# Altium footprint library Connectors.PcbLib: 268 footprints (part 4 of 21)
Each footprint in its own frame and in the unit in brackets; x right, y up, seen from the top. Pads: shape width x height; smd on the part's side, far side on the other; paste and mask are expansions set on the pad; w line width, h text height; cw(c..) or ccw(c..) is an arc to the next point about the centre after c.
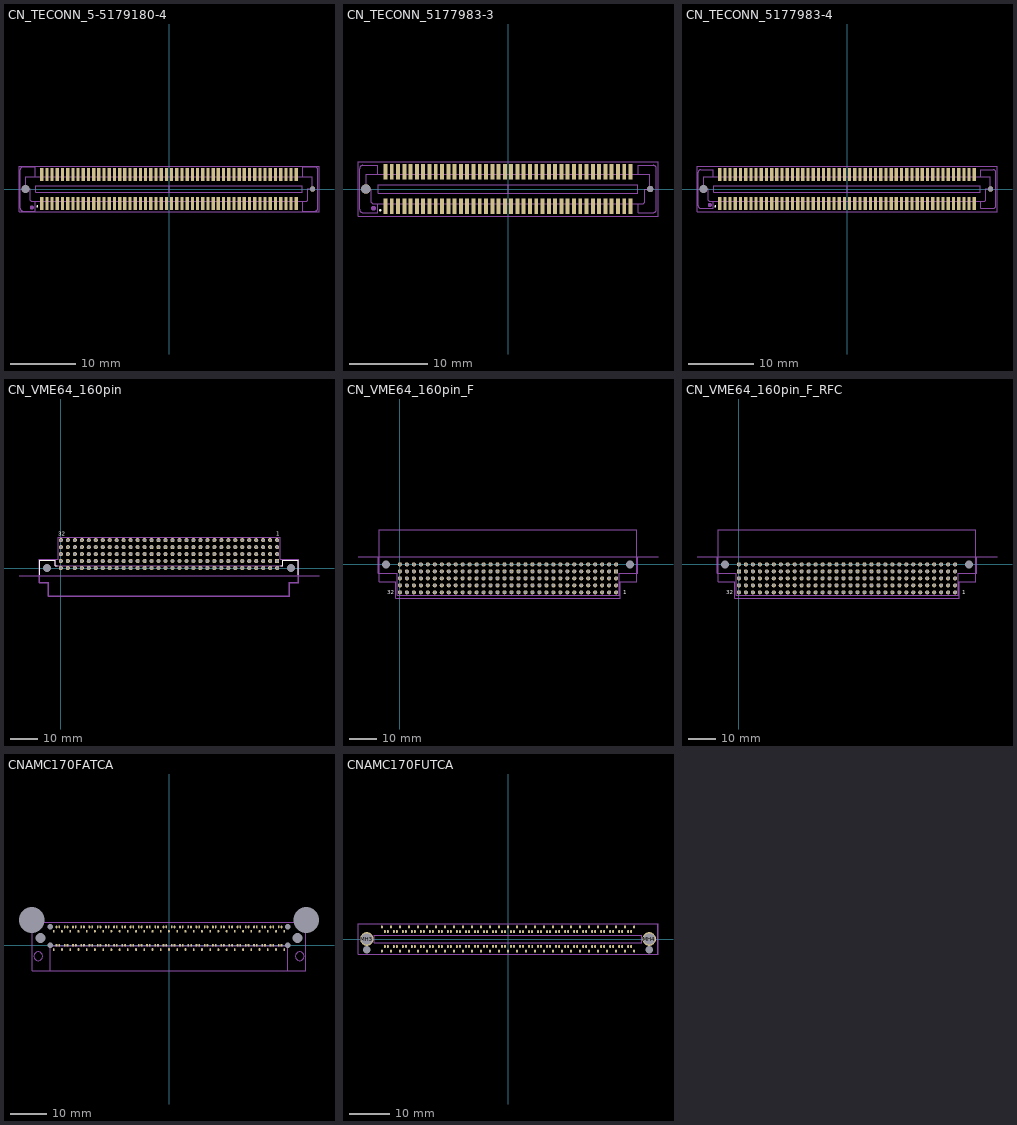
[diagram p3: the footprints below, top view; thin cyan lines are the x and y axes]

## CN_TECONN_5-5179180-4 [mm] "100pin 0.8mm Pitch Stacking Height 6mm Header-Stacking Connector female"
height 6
pads (102):
  rect 0.5x2 smd: 1(-19.6,-2.2) 2(-19.6,2.2) 3(-18.8,-2.2) 4(-18.8,2.2) 5(-18,-2.2) 6(-18,2.2) 7(-17.2,-2.2) 8(-17.2,2.2) 9(-16.4,-2.2) 10(-16.4,2.2) 11(-15.6,-2.2) 12(-15.6,2.2) 13(-14.8,-2.2) 14(-14.8,2.2) 15(-14,-2.2) 16(-14,2.2) 17(-13.2,-2.2) 18(-13.2,2.2) 19(-12.4,-2.2) 20(-12.4,2.2) 21(-11.6,-2.2) 22(-11.6,2.2) 23(-10.8,-2.2) 24(-10.8,2.2) 25(-10,-2.2) 26(-10,2.2) 27(-9.2,-2.2) 28(-9.2,2.2) 29(-8.4,-2.2) 30(-8.4,2.2) 31(-7.6,-2.2) 32(-7.6,2.2) 33(-6.8,-2.2) 34(-6.8,2.2) 35(-6,-2.2) 36(-6,2.2) 37(-5.2,-2.2) 38(-5.2,2.2) 39(-4.4,-2.2) 40(-4.4,2.2) 41(-3.6,-2.2) 42(-3.6,2.2) 43(-2.8,-2.2) 44(-2.8,2.2) 45(-2,-2.2) 46(-2,2.2) 47(-1.2,-2.2) 48(-1.2,2.2) 49(-0.4,-2.2) 50(-0.4,2.2) 51(0.4,-2.2) 52(0.4,2.2) 53(1.2,-2.2) 54(1.2,2.2) 55(2,-2.2) 56(2,2.2) 57(2.8,-2.2) 58(2.8,2.2) 59(3.6,-2.2) 60(3.6,2.2) 61(4.4,-2.2) 62(4.4,2.2) 63(5.2,-2.2) 64(5.2,2.2) 65(6,-2.2) 66(6,2.2) 67(6.8,-2.2) 68(6.8,2.2) 69(7.6,-2.2) 70(7.6,2.2) 71(8.4,-2.2) 72(8.4,2.2) 73(9.2,-2.2) 74(9.2,2.2) 75(10,-2.2) 76(10,2.2) 77(10.8,-2.2) 78(10.8,2.2) 79(11.6,-2.2) 80(11.6,2.2) 81(12.4,-2.2) 82(12.4,2.2) 83(13.2,-2.2) 84(13.2,2.2) 85(14,-2.2) 86(14,2.2) 87(14.8,-2.2) 88(14.8,2.2) 89(15.6,-2.2) 90(15.6,2.2) 91(16.4,-2.2) 92(16.4,2.2) 93(17.2,-2.2) 94(17.2,2.2) 95(18,-2.2) 96(18,2.2) 97(18.8,-2.2) 98(18.8,2.2) 99(19.6,-2.2) 100(19.6,2.2)
  round 0.79 hole 0.8 unplated: MH1(22.1,0)
  round 1.19 hole 1.2 unplated: MH2(-22.1,0)
Top Overlay:
  circle w0.178: c-20.274,-2.675 r0.074
Mechanical 13:
  circle w0.381: c-21.125,-2.85 r0.125
  lines w0.1: -22.9,-3 -22.9,3 ; -22.9,-3 ccw(c-22.5,-3) -22.5,-3.4 -20.6,-3.4 -20.6,-1.9 20.6,-1.9 20.6,-3.4 22.5,-3.4 ccw(c22.5,-3) 22.9,-3 22.9,3 ccw(c22.5,3) 22.5,3.4 20.6,3.4 20.6,1.9 -20.6,1.9 -20.6,3.4 -22.5,3.4 ccw(c-22.5,3) -22.9,3 ; -20.525,-0.525 -20.525,0.525 20.525,0.525 20.525,-0.525 -20.525,-0.525
  lines w0.102: -20.6,-1.9 -21.2,-1.9 -21.4,-1.7 -21.4,0 -22.075,0 -22.075,1.9 -20.6,1.9 ; 20.6,-1.9 21.199,-1.9 21.4,-1.7 21.4,0 22.075,0 22.075,1.9 20.6,1.9
Mechanical 15:
  lines w0.102: 0,-0.5 0,0.5 ; -23.1,-3.5 23.1,-3.5 23.1,3.5 -23.1,3.5 -23.1,-3.5
3D body "c-5-5179180-4-a-3d.stp": height 7.77, standoff -0.48, extent -22.9,-3.4 22.9,3.4

## CN_TECONN_5177983-3 [mm] "0.8mm Pitch Stacking Height 6mm Header-Stacking Connector female"
height 6
pads (82):
  rect 0.5x2 smd: 1(-15.6,-2.2) 2(-15.6,2.2) 3(-14.8,-2.2) 4(-14.8,2.2) 5(-14,-2.2) 6(-14,2.2) 7(-13.2,-2.2) 8(-13.2,2.2) 9(-12.4,-2.2) 10(-12.4,2.2) 11(-11.6,-2.2) 12(-11.6,2.2) 13(-10.8,-2.2) 14(-10.8,2.2) 15(-10,-2.2) 16(-10,2.2) 17(-9.2,-2.2) 18(-9.2,2.2) 19(-8.4,-2.2) 20(-8.4,2.2) 21(-7.6,-2.2) 22(-7.6,2.2) 23(-6.8,-2.2) 24(-6.8,2.2) 25(-6,-2.2) 26(-6,2.2) 27(-5.2,-2.2) 28(-5.2,2.2) 29(-4.4,-2.2) 30(-4.4,2.2) 31(-3.6,-2.2) 32(-3.6,2.2) 33(-2.8,-2.2) 34(-2.8,2.2) 35(-2,-2.2) 36(-2,2.2) 37(-1.2,-2.2) 38(-1.2,2.2) 39(-0.4,-2.2) 40(-0.4,2.2) 41(0.4,-2.2) 42(0.4,2.2) 43(1.2,-2.2) 44(1.2,2.2) 45(2,-2.2) 46(2,2.2) 47(2.8,-2.2) 48(2.8,2.2) 49(3.6,-2.2) 50(3.6,2.2) 51(4.4,-2.2) 52(4.4,2.2) 53(5.2,-2.2) 54(5.2,2.2) 55(6,-2.2) 56(6,2.2) 57(6.8,-2.2) 58(6.8,2.2) 59(7.6,-2.2) 60(7.6,2.2) 61(8.4,-2.2) 62(8.4,2.2) 63(9.2,-2.2) 64(9.2,2.2) 65(10,-2.2) 66(10,2.2) 67(10.8,-2.2) 68(10.8,2.2) 69(11.6,-2.2) 70(11.6,2.2) 71(12.4,-2.2) 72(12.4,2.2) 73(13.2,-2.2) 74(13.2,2.2) 75(14,-2.2) 76(14,2.2) 77(14.8,-2.2) 78(14.8,2.2) 79(15.6,-2.2) 80(15.6,2.2)
  round 0.79 hole 0.8 unplated: MH1(18.1,0)
  round 1.19 hole 1.2 unplated: MH2(-18.1,0)
Top Overlay:
  circle w0.178: c-16.274,-2.725 r0.074
Mechanical 13:
  circle w0.381: c-17.125,-2.45 r0.125
  lines w0.1: 16.599,-1.9 16.599,-3 18.499,-3 ccw(c18.5,-2.6) 18.9,-2.6 18.9,2.6 ccw(c18.5,2.6) 18.5,3 16.6,3 16.6,1.9 -16.6,1.9 -16.6,3 -18.5,3 ccw(c-18.5,2.6) -18.9,2.6 -18.9,-2.6 ccw(c-18.5,-2.6) -18.5,-3 -16.6,-3 -16.6,-1.9 16.6,-1.9 ; -16.525,-0.525 16.525,-0.525 16.525,0.525 -16.525,0.525 -16.525,-0.525
  lines w0.102: -16.6,-1.9 -17.2,-1.9 -17.4,-1.7 -17.4,0 -18.075,0 -18.075,1.9 -16.6,1.9 ; 16.599,-1.9 17.199,-1.9 17.4,-1.7 17.4,0 18.075,0 18.075,1.9 16.6,1.9
Mechanical 15:
  lines w0.102: 0,-0.5 0,0.5 ; -19.1,-3.5 -19.1,3.5 19.1,3.5 19.1,-3.5 -19.1,-3.5
3D body "c-5177983-03-a1-3d.stp": height 3.77, standoff -0.78, extent -18.9,-3 18.9,3

## CN_TECONN_5177983-4 [mm] "100pin 0.8mm Pitch Stacking Height 6mm Header-Stacking Connector female"
height 6
pads (102):
  rect 0.5x2 smd: 1(-19.6,-2.2) 2(-19.6,2.2) 3(-18.8,-2.2) 4(-18.8,2.2) 5(-18,-2.2) 6(-18,2.2) 7(-17.2,-2.2) 8(-17.2,2.2) 9(-16.4,-2.2) 10(-16.4,2.2) 11(-15.6,-2.2) 12(-15.6,2.2) 13(-14.8,-2.2) 14(-14.8,2.2) 15(-14,-2.2) 16(-14,2.2) 17(-13.2,-2.2) 18(-13.2,2.2) 19(-12.4,-2.2) 20(-12.4,2.2) 21(-11.6,-2.2) 22(-11.6,2.2) 23(-10.8,-2.2) 24(-10.8,2.2) 25(-10,-2.2) 26(-10,2.2) 27(-9.2,-2.2) 28(-9.2,2.2) 29(-8.4,-2.2) 30(-8.4,2.2) 31(-7.6,-2.2) 32(-7.6,2.2) 33(-6.8,-2.2) 34(-6.8,2.2) 35(-6,-2.2) 36(-6,2.2) 37(-5.2,-2.2) 38(-5.2,2.2) 39(-4.4,-2.2) 40(-4.4,2.2) 41(-3.6,-2.2) 42(-3.6,2.2) 43(-2.8,-2.2) 44(-2.8,2.2) 45(-2,-2.2) 46(-2,2.2) 47(-1.2,-2.2) 48(-1.2,2.2) 49(-0.4,-2.2) 50(-0.4,2.2) 51(0.4,-2.2) 52(0.4,2.2) 53(1.2,-2.2) 54(1.2,2.2) 55(2,-2.2) 56(2,2.2) 57(2.8,-2.2) 58(2.8,2.2) 59(3.6,-2.2) 60(3.6,2.2) 61(4.4,-2.2) 62(4.4,2.2) 63(5.2,-2.2) 64(5.2,2.2) 65(6,-2.2) 66(6,2.2) 67(6.8,-2.2) 68(6.8,2.2) 69(7.6,-2.2) 70(7.6,2.2) 71(8.4,-2.2) 72(8.4,2.2) 73(9.2,-2.2) 74(9.2,2.2) 75(10,-2.2) 76(10,2.2) 77(10.8,-2.2) 78(10.8,2.2) 79(11.6,-2.2) 80(11.6,2.2) 81(12.4,-2.2) 82(12.4,2.2) 83(13.2,-2.2) 84(13.2,2.2) 85(14,-2.2) 86(14,2.2) 87(14.8,-2.2) 88(14.8,2.2) 89(15.6,-2.2) 90(15.6,2.2) 91(16.4,-2.2) 92(16.4,2.2) 93(17.2,-2.2) 94(17.2,2.2) 95(18,-2.2) 96(18,2.2) 97(18.8,-2.2) 98(18.8,2.2) 99(19.6,-2.2) 100(19.6,2.2)
  round 0.79 hole 0.8 unplated: MH1(22.1,0)
  round 1.19 hole 1.2 unplated: MH2(-22.1,0)
Top Overlay:
  circle w0.178: c-20.274,-2.675 r0.074
Mechanical 13:
  circle w0.381: c-21.125,-2.45 r0.125
  lines w0.1: -22.9,-2.6 -22.9,2.6 ; -22.9,-2.6 ccw(c-22.5,-2.6) -22.5,-3 -20.6,-3 -20.6,-1.9 20.6,-1.9 20.6,-3 22.5,-3 ccw(c22.5,-2.6) 22.9,-2.6 22.9,2.6 ccw(c22.5,2.6) 22.5,3 20.6,3 20.6,1.9 -20.6,1.9 -20.6,3 -22.5,3 ccw(c-22.5,2.6) -22.9,2.6 ; -20.525,-0.525 20.525,-0.525 20.525,0.525 -20.525,0.525 -20.525,-0.525
  lines w0.102: -20.6,-1.9 -21.2,-1.9 -21.4,-1.7 -21.4,0 -22.075,0 -22.075,1.9 -20.6,1.9 ; 20.6,-1.9 21.199,-1.9 21.4,-1.7 21.4,0 22.075,0 22.075,1.9 20.6,1.9
Mechanical 15:
  lines w0.102: 0,-0.5 0,0.5 ; -23.1,-3.5 -23.1,3.5 23.1,3.5 23.1,-3.5 -23.1,-3.5
3D body "c-5177983-04-a1-3d.stp": height 3.77, standoff -0.78, extent -22.9,-3 22.9,3

## CN_VME64_160pin [mm] "160pin 2.54mm Pitch VME64 compatible DIN41612"
height 11
pads (162):
  rect 1.5x1.5 hole 1: A1(78.74,2.54)
  round 1.5 hole 1: A2(76.2,2.54) A3(73.66,2.54) A4(71.12,2.54) A5(68.58,2.54) A6(66.04,2.54) A7(63.5,2.54) A8(60.96,2.54) A9(58.42,2.54) A10(55.88,2.54) A11(53.34,2.54) A12(50.8,2.54) A13(48.26,2.54) A14(45.72,2.54) A15(43.18,2.54) A16(40.64,2.54) A17(38.1,2.54) A18(35.56,2.54) A19(33.02,2.54) A20(30.48,2.54) A21(27.94,2.54) A22(25.4,2.54) A23(22.86,2.54) A24(20.32,2.54) A25(17.78,2.54) A26(15.24,2.54) A27(12.7,2.54) A28(10.16,2.54) A29(7.62,2.54) A30(5.08,2.54) A31(2.54,2.54) A32(0,2.54) B1(78.74,5.08) B2(76.2,5.08) B3(73.66,5.08) B4(71.12,5.08) B5(68.58,5.08) B6(66.04,5.08) B7(63.5,5.08) B8(60.96,5.08) B9(58.42,5.08) B10(55.88,5.08) B11(53.34,5.08) B12(50.8,5.08) B13(48.26,5.08) B14(45.72,5.08) B15(43.18,5.08) B16(40.64,5.08) B17(38.1,5.08) B18(35.56,5.08) B19(33.02,5.08) B20(30.48,5.08) B21(27.94,5.08) B22(25.4,5.08) B23(22.86,5.08) B24(20.32,5.08) B25(17.78,5.08) B26(15.24,5.08) B27(12.7,5.08) B28(10.16,5.08) B29(7.62,5.08) B30(5.08,5.08) B31(2.54,5.08) B32(0,5.08) C1(78.74,7.62) C2(76.2,7.62) C3(73.66,7.62) C4(71.12,7.62) C5(68.58,7.62) C6(66.04,7.62) C7(63.5,7.62) C8(60.96,7.62) C9(58.42,7.62) C10(55.88,7.62) C11(53.34,7.62) C12(50.8,7.62) C13(48.26,7.62) C14(45.72,7.62) C15(43.18,7.62) C16(40.64,7.62) C17(38.1,7.62) C18(35.56,7.62) C19(33.02,7.62) C20(30.48,7.62) C21(27.94,7.62) C22(25.4,7.62) C23(22.86,7.62) C24(20.32,7.62) C25(17.78,7.62) C26(15.24,7.62) C27(12.7,7.62) C28(10.16,7.62) C29(7.62,7.62) C30(5.08,7.62) C31(2.54,7.62) C32(0,7.62) D1(78.74,10.16) D2(76.2,10.16) D3(73.66,10.16) D4(71.12,10.16) D5(68.58,10.16) D6(66.04,10.16) D7(63.5,10.16) D8(60.96,10.16) D9(58.42,10.16) D10(55.88,10.16) D11(53.34,10.16) D12(50.8,10.16) D13(48.26,10.16) D14(45.72,10.16) D15(43.18,10.16) D16(40.64,10.16) D17(38.1,10.16) D18(35.56,10.16) D19(33.02,10.16) D20(30.48,10.16) D21(27.94,10.16) D22(25.4,10.16) D23(22.86,10.16) D24(20.32,10.16) D25(17.78,10.16) D26(15.24,10.16) D27(12.7,10.16) D28(10.16,10.16) D29(7.62,10.16) D30(5.08,10.16) D31(2.54,10.16) D32(0,10.16) Z1(78.74,0) Z2(76.2,0) Z3(73.66,0) Z4(71.12,0) Z5(68.58,0) Z6(66.04,0) Z7(63.5,0) Z8(60.96,0) Z9(58.42,0) Z10(55.88,0) Z11(53.34,0) Z12(50.8,0) Z13(48.26,0) Z14(45.72,0) Z15(43.18,0) Z16(40.64,0) Z17(38.1,0) Z18(35.56,0) Z19(33.02,0) Z20(30.48,0) Z21(27.94,0) Z22(25.4,0) Z23(22.86,0) Z24(20.32,0) Z25(17.78,0) Z26(15.24,0) Z27(12.7,0) Z28(10.16,0) Z29(7.62,0) Z30(5.08,0) Z31(2.54,0) Z32(0,0)
  round 2.5 hole 2.8 unplated: MH1(-5.08,0) MH2(83.82,0)
Top Overlay:
  lines w0.2: -7.63,-2.46 -7.63,2.9 -2.13,2.9 -2.13,0.9 -1.378,0.9 ; 80.108,0.9 80.86,0.9 80.86,2.9 86.36,2.9 86.36,-2.46
  text "1" at 78.49,11.79 h1.5
  text "32" at -1.01,11.79 h1.5
Mechanical 13:
  lines w0.1: -7.63,-5.1 -4.38,-5.101 -4.38,-10.1 83.12,-10.1 83.12,-5.101 86.37,-5.1 86.37,2.9 80.87,2.9 80.87,0.9 -2.13,0.9 -2.13,2.9 -7.63,2.9 -7.63,-5.1
Mechanical 15:
  lines w0.1: -15.26,-2.76 93.99,-2.76 ; 78.24,2.54 79.24,2.54 ; 78.74,2.04 78.74,3.04 ; 86.61,3.18 86.61,-5.35 83.36,-5.351 83.36,-10.35 -4.63,-10.35 -4.63,-5.351 -7.88,-5.35 -7.88,3.18 -1.05,3.18 -1.05,11.21 79.79,11.21 79.79,3.18 86.62,3.18
  text "Board Edge" at -23.51,-5.21 h1.5
3D body: height 4.3, standoff 3.7, extent -0.3,-8.5 0.3,5.38
3D body: height 4.3, standoff -3, extent -0.3,4.78 0.3,5.38
3D body: height 8, standoff -1.55, extent 81.97,-5.85 83.12,-4.2
3D body: height 9.55, standoff 9.37, extent 79.365,-10.1 83.12,0.4
3D body: height 9.55, standoff 6, extent 80.87,-4.2 83.12,-3.3
3D body: height 9.55, standoff 5.92, extent 80.47,-10.1 83.12,-3.7
3D body: height 5.92, standoff 4.75, extent 81.97,-10.1 83.12,-5.85
3D body: height 1.15, standoff 0, extent 79.365,-3 80.87,0.9
3D body: height -0.33, standoff -1.37, extent 78.115,-10.1 79.365,-8.1
3D body: height -0.33, standoff -1.55, extent 79.365,-10.1 83.12,-3
3D body: height 1.55, standoff -1.55, extent 83.12,-5.1 86.37,-3
3D body: height 8, standoff 0, extent 80.87,-3.3 83.12,-1.241
3D body: height 3.25, standoff -1.55, extent 81.97,-10.1 83.12,-5.85
3D body: height -0.33, standoff -0.82, extent 78.115,-8.1 79.365,-3.527
3D body: height 9.55, standoff 0, extent 79.365,-3.3 80.87,0.4
3D body: height 8.34, standoff 0, extent 78.115,-3.65 79.365,0.4
3D body: height 0.7, standoff -0.33, extent -3.23,-4.2 81.97,-3.7
3D body: height 1.15, standoff 0.63, extent -0.625,0.4 79.365,0.9
3D body: height 8.34, standoff 0.63, extent -2.73,-3.7 81.47,0.4
3D body: height 8.34, standoff 0, extent -0.625,-3.65 0.625,0.4
3D body: height 9.55, standoff 0, extent -2.13,-3.3 -0.625,0.4
3D body: height -0.33, standoff -0.82, extent -0.625,-8.1 0.625,-3.527
3D body: height 3.25, standoff -1.55, extent -4.38,-10.1 -3.23,-5.85
3D body: height 8, standoff 0, extent -4.38,-3.3 -2.13,-1.241
3D body: height 1.55, standoff -1.55, extent -7.63,-5.1 -4.38,-3
3D body: height -0.33, standoff -1.55, extent -4.38,-10.1 -0.625,-3
3D body: height -0.33, standoff -1.37, extent -0.625,-10.1 0.625,-8.1
3D body: height 1.15, standoff 0, extent -2.13,-3 -0.625,0.9
3D body: height 5.92, standoff 4.75, extent -4.38,-10.1 -3.23,-5.85
3D body: height 9.55, standoff 5.92, extent -4.38,-10.1 -1.73,-3.7
3D body: height 9.55, standoff 6, extent -4.38,-4.2 -2.13,-3.3
3D body: height 9.55, standoff 9.37, extent -4.38,-10.1 -0.625,0.4
3D body: height 9.37, standoff 8.32, extent -2.83,-10.1 80.87,-3.3
3D body: height 9.55, standoff 9.37, extent 0.625,-10.1 78.115,0.4
3D body: height 9.55, standoff 8.34, extent 0.625,-3.65 78.115,0.4
3D body: height 8, standoff -1.55, extent -4.38,-5.85 -3.23,-4.2
3D body: height -0.33, standoff -1.55, extent 0.625,-10.1 78.115,-3
3D body: height 1.15, standoff 0, extent 0.625,-3 78.115,0.9
3D body: height 8.94, standoff -3, extent -0.3,9.86 0.3,10.46
3D body: height 8.94, standoff 8.34, extent -0.3,-2.95 0.3,10.46
3D body: height 9.42, standoff 8.94, extent -0.3,-8 0.3,-2.95
3D body: height 6.84, standoff -3, extent -0.3,7.32 0.3,7.92
3D body: height 6.84, standoff 6.24, extent -0.3,-8.5 0.3,7.92
3D body: height 1.76, standoff -3, extent -0.3,2.24 0.3,2.84
3D body: height 1.76, standoff 1.16, extent -0.3,-8.5 0.3,2.84
3D body: height 0, standoff -3, extent -0.3,-0.3 0.3,0.3
3D body: height 0, standoff -3, extent 2.24,-0.3 2.84,0.3
3D body: height 1.76, standoff 1.16, extent 2.24,-8.5 2.84,2.84
3D body: height 1.76, standoff -3, extent 2.24,2.24 2.84,2.84
3D body: height 6.84, standoff 6.24, extent 2.24,-8.5 2.84,7.92
3D body: height 6.84, standoff -3, extent 2.24,7.32 2.84,7.92
3D body: height 9.42, standoff 8.94, extent 2.24,-8 2.84,-2.95
3D body: height 8.94, standoff 8.34, extent 2.24,-2.95 2.84,10.46
3D body: height 8.94, standoff -3, extent 2.24,9.86 2.84,10.46
3D body: height 4.3, standoff -3, extent 2.24,4.78 2.84,5.38
3D body: height 4.3, standoff 3.7, extent 2.24,-8.5 2.84,5.38
3D body: height 0, standoff -3, extent 4.78,-0.3 5.38,0.3
3D body: height 1.76, standoff 1.16, extent 4.78,-8.5 5.38,2.84
3D body: height 1.76, standoff -3, extent 4.78,2.24 5.38,2.84
3D body: height 6.84, standoff 6.24, extent 4.78,-8.5 5.38,7.92
3D body: height 6.84, standoff -3, extent 4.78,7.32 5.38,7.92
3D body: height 9.42, standoff 8.94, extent 4.78,-8 5.38,-2.95
3D body: height 8.94, standoff 8.34, extent 4.78,-2.95 5.38,10.46
3D body: height 8.94, standoff -3, extent 4.78,9.86 5.38,10.46
3D body: height 4.3, standoff -3, extent 4.78,4.78 5.38,5.38
3D body: height 4.3, standoff 3.7, extent 4.78,-8.5 5.38,5.38
3D body: height 0, standoff -3, extent 7.32,-0.3 7.92,0.3
3D body: height 1.76, standoff 1.16, extent 7.32,-8.5 7.92,2.84
3D body: height 1.76, standoff -3, extent 7.32,2.24 7.92,2.84
3D body: height 6.84, standoff 6.24, extent 7.32,-8.5 7.92,7.92
3D body: height 6.84, standoff -3, extent 7.32,7.32 7.92,7.92
3D body: height 9.42, standoff 8.94, extent 7.32,-8 7.92,-2.95
3D body: height 8.94, standoff 8.34, extent 7.32,-2.95 7.92,10.46
3D body: height 8.94, standoff -3, extent 7.32,9.86 7.92,10.46
3D body: height 4.3, standoff -3, extent 7.32,4.78 7.92,5.38
3D body: height 4.3, standoff 3.7, extent 7.32,-8.5 7.92,5.38
3D body: height 0, standoff -3, extent 9.86,-0.3 10.46,0.3
3D body: height 1.76, standoff 1.16, extent 9.86,-8.5 10.46,2.84
3D body: height 1.76, standoff -3, extent 9.86,2.24 10.46,2.84
3D body: height 6.84, standoff 6.24, extent 9.86,-8.5 10.46,7.92
3D body: height 6.84, standoff -3, extent 9.86,7.32 10.46,7.92
3D body: height 9.42, standoff 8.94, extent 9.86,-8 10.46,-2.95
3D body: height 8.94, standoff 8.34, extent 9.86,-2.95 10.46,10.46
3D body: height 8.94, standoff -3, extent 9.86,9.86 10.46,10.46
3D body: height 4.3, standoff -3, extent 9.86,4.78 10.46,5.38
3D body: height 4.3, standoff 3.7, extent 9.86,-8.5 10.46,5.38
3D body: height 0, standoff -3, extent 12.4,-0.3 13,0.3
3D body: height 1.76, standoff 1.16, extent 12.4,-8.5 13,2.84
3D body: height 1.76, standoff -3, extent 12.4,2.24 13,2.84
3D body: height 6.84, standoff 6.24, extent 12.4,-8.5 13,7.92
3D body: height 6.84, standoff -3, extent 12.4,7.32 13,7.92
3D body: height 9.42, standoff 8.94, extent 12.4,-8 13,-2.95
3D body: height 8.94, standoff 8.34, extent 12.4,-2.95 13,10.46
3D body: height 8.94, standoff -3, extent 12.4,9.86 13,10.46
3D body: height 4.3, standoff -3, extent 12.4,4.78 13,5.38
3D body: height 4.3, standoff 3.7, extent 12.4,-8.5 13,5.38
3D body: height 0, standoff -3, extent 14.94,-0.3 15.54,0.3
3D body: height 1.76, standoff 1.16, extent 14.94,-8.5 15.54,2.84
3D body: height 1.76, standoff -3, extent 14.94,2.24 15.54,2.84
3D body: height 6.84, standoff 6.24, extent 14.94,-8.5 15.54,7.92
3D body: height 6.84, standoff -3, extent 14.94,7.32 15.54,7.92
3D body: height 9.42, standoff 8.94, extent 14.94,-8 15.54,-2.95
3D body: height 8.94, standoff 8.34, extent 14.94,-2.95 15.54,10.46
3D body: height 8.94, standoff -3, extent 14.94,9.86 15.54,10.46
3D body: height 4.3, standoff -3, extent 14.94,4.78 15.54,5.38
3D body: height 4.3, standoff 3.7, extent 14.94,-8.5 15.54,5.38
3D body: height 0, standoff -3, extent 17.48,-0.3 18.08,0.3
3D body: height 1.76, standoff 1.16, extent 17.48,-8.5 18.08,2.84
3D body: height 1.76, standoff -3, extent 17.48,2.24 18.08,2.84
3D body: height 6.84, standoff 6.24, extent 17.48,-8.5 18.08,7.92
3D body: height 6.84, standoff -3, extent 17.48,7.32 18.08,7.92
3D body: height 9.42, standoff 8.94, extent 17.48,-8 18.08,-2.95
3D body: height 8.94, standoff 8.34, extent 17.48,-2.95 18.08,10.46
3D body: height 8.94, standoff -3, extent 17.48,9.86 18.08,10.46
3D body: height 4.3, standoff -3, extent 17.48,4.78 18.08,5.38
3D body: height 4.3, standoff 3.7, extent 17.48,-8.5 18.08,5.38
3D body: height 0, standoff -3, extent 20.02,-0.3 20.62,0.3
3D body: height 1.76, standoff 1.16, extent 20.02,-8.5 20.62,2.84
3D body: height 1.76, standoff -3, extent 20.02,2.24 20.62,2.84
3D body: height 6.84, standoff 6.24, extent 20.02,-8.5 20.62,7.92
3D body: height 6.84, standoff -3, extent 20.02,7.32 20.62,7.92
3D body: height 9.42, standoff 8.94, extent 20.02,-8 20.62,-2.95
3D body: height 8.94, standoff 8.34, extent 20.02,-2.95 20.62,10.46
3D body: height 8.94, standoff -3, extent 20.02,9.86 20.62,10.46
3D body: height 4.3, standoff -3, extent 20.02,4.78 20.62,5.38
3D body: height 4.3, standoff 3.7, extent 20.02,-8.5 20.62,5.38
3D body: height 0, standoff -3, extent 22.56,-0.3 23.16,0.3
3D body: height 1.76, standoff 1.16, extent 22.56,-8.5 23.16,2.84
3D body: height 1.76, standoff -3, extent 22.56,2.24 23.16,2.84
3D body: height 6.84, standoff 6.24, extent 22.56,-8.5 23.16,7.92
3D body: height 6.84, standoff -3, extent 22.56,7.32 23.16,7.92
3D body: height 9.42, standoff 8.94, extent 22.56,-8 23.16,-2.95
3D body: height 8.94, standoff 8.34, extent 22.56,-2.95 23.16,10.46
3D body: height 8.94, standoff -3, extent 22.56,9.86 23.16,10.46
3D body: height 4.3, standoff -3, extent 22.56,4.78 23.16,5.38
3D body: height 4.3, standoff 3.7, extent 22.56,-8.5 23.16,5.38
3D body: height 0, standoff -3, extent 25.1,-0.3 25.7,0.3
3D body: height 1.76, standoff 1.16, extent 25.1,-8.5 25.7,2.84
3D body: height 1.76, standoff -3, extent 25.1,2.24 25.7,2.84
3D body: height 6.84, standoff 6.24, extent 25.1,-8.5 25.7,7.92
3D body: height 6.84, standoff -3, extent 25.1,7.32 25.7,7.92
3D body: height 9.42, standoff 8.94, extent 25.1,-8 25.7,-2.95
3D body: height 8.94, standoff 8.34, extent 25.1,-2.95 25.7,10.46
3D body: height 8.94, standoff -3, extent 25.1,9.86 25.7,10.46
3D body: height 4.3, standoff -3, extent 25.1,4.78 25.7,5.38
3D body: height 4.3, standoff 3.7, extent 25.1,-8.5 25.7,5.38
3D body: height 0, standoff -3, extent 27.64,-0.3 28.24,0.3
3D body: height 1.76, standoff 1.16, extent 27.64,-8.5 28.24,2.84
3D body: height 1.76, standoff -3, extent 27.64,2.24 28.24,2.84
3D body: height 6.84, standoff 6.24, extent 27.64,-8.5 28.24,7.92
3D body: height 6.84, standoff -3, extent 27.64,7.32 28.24,7.92
3D body: height 9.42, standoff 8.94, extent 27.64,-8 28.24,-2.95
3D body: height 8.94, standoff 8.34, extent 27.64,-2.95 28.24,10.46
3D body: height 8.94, standoff -3, extent 27.64,9.86 28.24,10.46
3D body: height 4.3, standoff -3, extent 27.64,4.78 28.24,5.38
3D body: height 4.3, standoff 3.7, extent 27.64,-8.5 28.24,5.38
3D body: height 0, standoff -3, extent 30.18,-0.3 30.78,0.3
3D body: height 1.76, standoff 1.16, extent 30.18,-8.5 30.78,2.84
3D body: height 1.76, standoff -3, extent 30.18,2.24 30.78,2.84
3D body: height 6.84, standoff 6.24, extent 30.18,-8.5 30.78,7.92
3D body: height 6.84, standoff -3, extent 30.18,7.32 30.78,7.92
3D body: height 9.42, standoff 8.94, extent 30.18,-8 30.78,-2.95
3D body: height 8.94, standoff 8.34, extent 30.18,-2.95 30.78,10.46
3D body: height 8.94, standoff -3, extent 30.18,9.86 30.78,10.46
3D body: height 4.3, standoff -3, extent 30.18,4.78 30.78,5.38
3D body: height 4.3, standoff 3.7, extent 30.18,-8.5 30.78,5.38
3D body: height 0, standoff -3, extent 32.72,-0.3 33.32,0.3
3D body: height 1.76, standoff 1.16, extent 32.72,-8.5 33.32,2.84
3D body: height 1.76, standoff -3, extent 32.72,2.24 33.32,2.84
3D body: height 6.84, standoff 6.24, extent 32.72,-8.5 33.32,7.92
3D body: height 6.84, standoff -3, extent 32.72,7.32 33.32,7.92
3D body: height 9.42, standoff 8.94, extent 32.72,-8 33.32,-2.95
3D body: height 8.94, standoff 8.34, extent 32.72,-2.95 33.32,10.46
3D body: height 8.94, standoff -3, extent 32.72,9.86 33.32,10.46
3D body: height 4.3, standoff -3, extent 32.72,4.78 33.32,5.38
3D body: height 4.3, standoff 3.7, extent 32.72,-8.5 33.32,5.38
3D body: height 0, standoff -3, extent 35.26,-0.3 35.86,0.3
3D body: height 1.76, standoff 1.16, extent 35.26,-8.5 35.86,2.84
3D body: height 1.76, standoff -3, extent 35.26,2.24 35.86,2.84
3D body: height 6.84, standoff 6.24, extent 35.26,-8.5 35.86,7.92
3D body: height 6.84, standoff -3, extent 35.26,7.32 35.86,7.92
3D body: height 9.42, standoff 8.94, extent 35.26,-8 35.86,-2.95
3D body: height 8.94, standoff 8.34, extent 35.26,-2.95 35.86,10.46
3D body: height 8.94, standoff -3, extent 35.26,9.86 35.86,10.46
3D body: height 4.3, standoff -3, extent 35.26,4.78 35.86,5.38
3D body: height 4.3, standoff 3.7, extent 35.26,-8.5 35.86,5.38
3D body: height 0, standoff -3, extent 37.8,-0.3 38.4,0.3
3D body: height 1.76, standoff 1.16, extent 37.8,-8.5 38.4,2.84
3D body: height 1.76, standoff -3, extent 37.8,2.24 38.4,2.84